# Altium footprint library Amirreza.PcbLib: 524 footprints (part 2 of 33)
Each footprint in its own frame and in the unit in brackets; x right, y up, seen from the top. Pads: shape width x height; smd on the part's side, far side on the other; paste and mask are expansions set on the pad; w line width, h text height; cw(c..) or ccw(c..) is an arc to the next point about the centre after c.
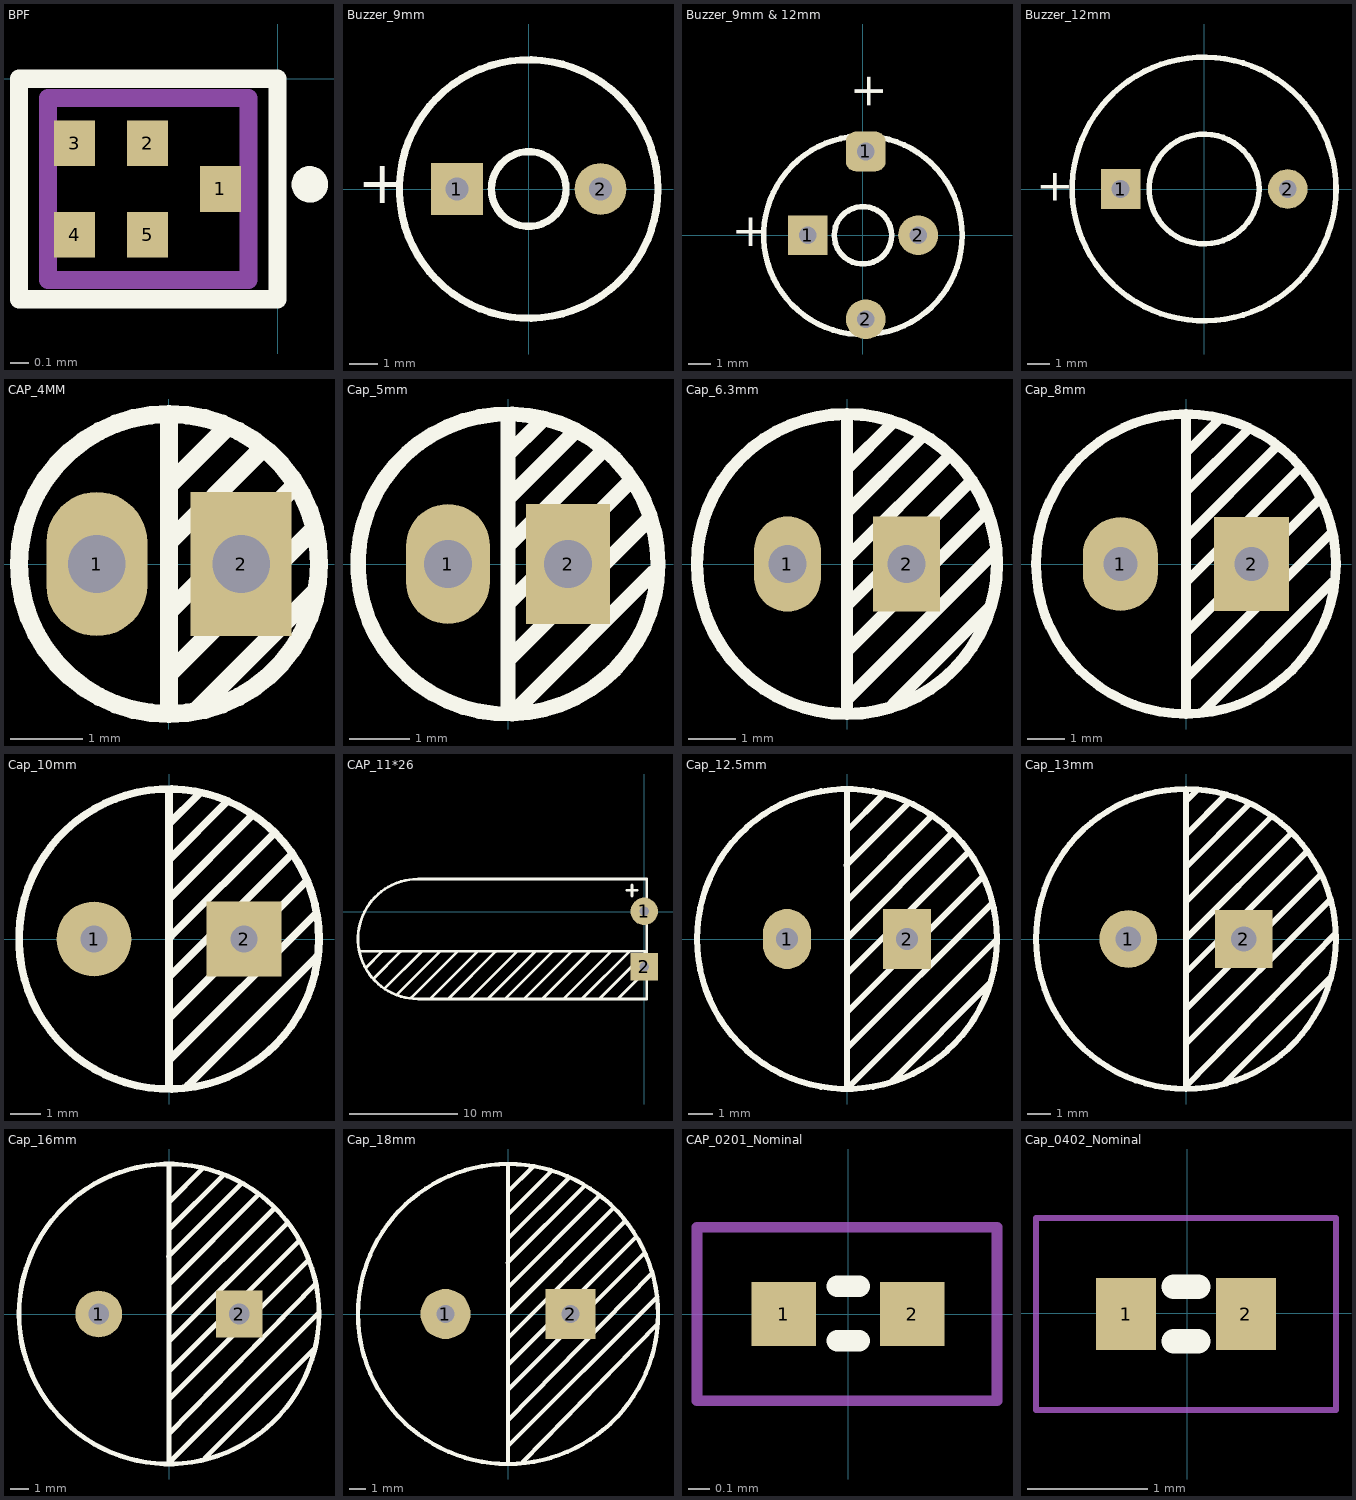
[diagram p1: the footprints below, top view; thin cyan lines are the x and y axes]

## BPF [mm]
pads (5):
  rect 0.225x0.25 smd: 1(-0.314,-0.605) 2(-0.714,-0.355) 3(-1.114,-0.355) 4(-1.114,-0.855) 5(-0.714,-0.855)
Top Overlay:
  circle w0.1: c0.177,-0.58 r0.05
  lines w0.1: -1.42,-1.21 0,-1.21 0,0 -1.42,0 -1.42,-1.21
Top Assembly:
  lines w0.1: -1.26,-1.105 -0.16,-1.105 -0.16,-0.105 -1.26,-0.105 -1.26,-1.105
3D body "User Library-SAFFB1G56KB0F0A.STEP": height 0.15, standoff 0, extent -1.26,-1.055 -0.16,-0.155

## Buzzer_9mm [mm]
pads (2):
  rect 1.8x1.8 hole 0.8: 1(-2.5,0)
  round 1.8 hole 0.8: 2(2.5,0)
Top Overlay:
  circle w0.254: c0,0 r4.5
  circle w0.254: c0,0 r1.3
  text "+" at -5.944,0.787 h1.5
3D body "User Library-Buzzer_9mm.STEP": height 5.6, standoff -5.4, extent -4.55,-4.55 4.55,4.55

## Buzzer_9mm & 12mm [mm]
pads (4):
  rect 1.8x1.8 hole 0.8: 1(-2.5,0)
  rrect50% 1.8x1.8 hole 0.8: 1(0.127,3.8)
  round 1.8 hole 0.8: 2(0.127,-3.8) 2(2.5,0)
Top Overlay:
  circle w0.254: c0,0 r4.5
  circle w0.254: c0,0 r1.3
  text "+" at -5.944,0.787 h1.5
  text "+" at 0.914,7.396 h1.5
3D body "User Library-Buzzer_9mm.STEP": height 5.6, standoff -5.4, extent -4.55,-4.55 4.55,4.55

## Buzzer_12mm [mm]
pads (2):
  rect 1.8x1.8 hole 0.8: 1(-3.8,0)
  round 1.8 hole 0.8: 2(3.8,0)
Top Overlay:
  circle w0.254: c0,0 r2.5
  circle w0.254: c0,0 r6
  text "+" at -7.645,0.711 h1.5
3D body "User Library-buzzer12.step": height 7.53, standoff -1.97, extent -6,-5.993 6,5.993

## CAP_4MM [mm]
height 2.65
pads (2):
  oval 1.4x2 hole 0.8: 1(-1,0)
  rect 1.4x2 hole 0.8: 2(1,0)
Top Overlay:
  circle w0.254: c0,0 r2.08
  lines w0.254: 0,-2.057 0,2.057 ; 0,-0.66 1.727,1.067 ; 0,0.305 1.245,1.549 ; 0,1.092 0.787,1.88 ; 0.025,-1.499 1.969,0.445 ; 0.381,-2.032 2.032,-0.381
3D body "User Library-ECAP4_6_15.step": height 6.05, standoff -2.25, extent -2,-2 2,2

## Cap_5mm [mm]
pads (2):
  oval 1.4x2 hole 0.8: 1(-1,0)
  rect 1.4x2 hole 0.8: 2(1,0)
Top Overlay:
  circle w0.254: c0,0 r2.5
  lines w0.254: 0,-2.413 0,2.489 ; 0,-1.6 2.349,0.749 ; 0,-0.66 2.045,1.384 ; 0,0.305 1.549,1.854 ; 0,1.092 1.092,2.184 ; 0,1.829 0.539,2.368 ; 0.076,-2.489 2.413,-0.152
3D body "User Library-Cap electro 5x11x2mm.step": height 11.33, standoff -3.47, extent -2.525,-2.525 2.526,2.526

## Cap_6.3mm [mm]
pads (2):
  oval 1.4x2 hole 0.8: 1(-1.25,0)
  rect 1.4x2 hole 0.8: 2(1.25,0)
Top Overlay:
  circle w0.254: c0,0 r3.15
  lines w0.254: 0,-3.073 0,3.124 ; 0,-2.845 3.086,0.241 ; 0,-1.829 2.934,1.105 ; 0,-0.864 2.578,1.714 ; 0,1.092 1.562,2.654 ; 0.02,2.026 0.94,2.946 ; 0.051,0.178 2.146,2.273 ; 0.965,-2.946 2.997,-0.914
3D body "User Library-ECAP6_3_6_5_25.step": height 6.55, standoff -2.25, extent -3.15,-3.149 3.15,3.148

## Cap_8mm [mm]
pads (2):
  oval 2x2.5 hole 0.9: 1(-1.75,0)
  rect 2x2.5 hole 0.9: 2(1.75,0)
Top Overlay:
  circle w0.254: c0,0 r4
  lines w0.254: 0,-3.912 0,3.835 ; 0,-3.048 3.861,0.813 ; 0,-1.829 3.569,1.74 ; 0,-0.483 3.048,2.565 ; 0,0.711 2.388,3.099 ; 0,1.93 1.618,3.549 ; 0.045,3.017 0.889,3.861 ; 0.432,-3.962 3.924,-0.47 ; 1.737,-0.072 1.737,0.182
3D body "User Library-ECAP8_8_35.step": height 8.05, standoff -2.25, extent -4,-3.998 4,3.998

## Cap_10mm [mm]
pads (2):
  round 2.5 hole 0.9: 1(-2.5,0)
  rect 2.5x2.5 hole 0.9: 2(2.5,0)
Top Overlay:
  circle w0.254: c0,0 r5
  lines w0.254: 0,-4.928 0,4.928 ; 0,-4.039 4.902,0.864 ; 0,-2.642 4.521,1.88 ; 0,1.346 2.743,4.089 ; 0,2.642 1.943,4.585 ; 0,3.835 0.978,4.813 ; 0.076,-1.194 4.077,2.807 ; 0.076,0.102 3.505,3.531 ; 0.635,-4.877 4.928,-0.584 ; 1.737,-0.072 1.737,0.182
3D body "User Library-Cap electro 10x12_5x5_0mm.STEP": height 12.83, standoff -3.68, extent -5.025,-5.025 5.026,5.026

## CAP_11*26 [mm]
pads (2):
  round 2.524 hole 0.9: 1(-0.006,0.025)
  rect 2.524x2.524 hole 0.9: 2(-0.006,-5.055)
Top Overlay:
  lines w0.254: -26.111,-3.632 0.223,-3.632 0.223,-3.652 -4.14,-8.015 ; -25.52,-5.138 -24.06,-3.677 ; -24.822,-6.115 -22.383,-3.677 ; -23.806,-7.03 -20.428,-3.652 ; -22.701,-7.601 -18.751,-3.652 ; -21.431,-7.932 -17.151,-3.652 ; -19.621,-7.976 -15.322,-3.677 ; -17.92,-7.951 -13.646,-3.677 ; -16.015,-7.976 -11.69,-3.652 ; -14.364,-8.002 -10.014,-3.652 ; -12.776,-8.015 -8.413,-3.652 ; -10.986,-7.976 -6.686,-3.677 ; -9.284,-7.951 -5.01,-3.677 ; -7.379,-7.976 -3.054,-3.652 ; -5.728,-8.002 -1.378,-3.652 ; -2.394,-7.97 0.271,-5.306 ; -1.606,1.969 -0.641,1.969 ; -1.123,1.436 -1.123,2.452 ; 0.223,-8.015 -20.777,-8.015 cw(c-20.777,-2.515) -20.777,2.985 0.223,2.985 0.223,-7.964

## Cap_12.5mm [mm]
pads (2):
  oval 2x2.5 hole 0.9: 1(-2.5,0)
  rect 2x2.5 hole 0.9: 2(2.5,0)
Top Overlay:
  circle w0.254: c0,0 r6.25
  lines w0.254: -0.025,3.073 2.54,5.639 ; 0,-4.547 6.045,1.499 ; 0,-3.048 5.626,2.578 ; 0,-1.448 5.08,3.632 ; 0,1.6 3.492,5.093 ; 0,4.521 1.486,6.007 ; 0,6.248 0,-6.248 6.249,0.001 ; 0.076,0.102 4.394,4.42 ; 1.737,-0.072 1.737,0.182 ; 1.918,-5.88 5.969,-1.829
3D body "User Library-JAMICON_TK_D(12_5)F(5)L(20).step": height 20.08, standoff -1.45, extent -6.25,-6.25 6.28,6.25

## Cap_13mm [mm]
pads (2):
  round 2.5 hole 1.1: 1(-2.5,0)
  rect 2.5x2.5 hole 1.1: 2(2.5,0)
Top Overlay:
  circle w0.254: c0,0 r6.5
  lines w0.254: 0,-6.497 0,6.499 ; 0,-6.375 6.487,0.244 ; 0,-4.547 6.248,1.702 ; 0,-3.048 5.842,2.794 ; 0,-1.448 5.232,3.785 ; 0,1.6 3.708,5.309 ; 0,4.521 1.727,6.248 ; 0,5.969 0.508,6.477 ; 0.025,3.124 2.769,5.867 ; 0.076,0.102 4.572,4.597 ; 1.651,-6.274 6.274,-1.651
3D body "User Library-Cap-EL(13x25-5).step": height 25.1, standoff -3.2, extent -6.5,-6.499 6.502,6.499

## Cap_16mm [mm]
pads (2):
  round 2.5 hole 1.1: 1(-3.75,0)
  rect 2.5x2.5 hole 1.1: 2(3.75,0)
Top Overlay:
  circle w0.254: c0,0 r8
  lines w0.254: -0.025,3.073 3.848,6.947 ; 0,-6.375 7.77,1.552 ; 0,-4.547 7.366,2.819 ; 0,-3.048 6.947,3.899 ; 0,-1.448 6.299,4.851 ; 0,1.6 4.763,6.363 ; 0,4.521 2.857,7.379 ; 0,5.969 1.803,7.772 ; 0,8.001 0,-7.925 7.962,0.038 ; 0.076,0.102 5.601,5.626 ; 1.905,-7.696 7.747,-1.854
3D body "User Library-JAMICON_TK_D(16)F(7_5)L(25).step": height 25.13, standoff -1.4, extent -8,-8 8.03,8

## Cap_18mm [mm]
pads (2):
  round 3 hole 1.1: 1(-3.75,0)
  rect 3x3 hole 1.1: 2(3.75,0)
Top Overlay:
  circle w0.254: c0,0 r9
  lines w0.254: -0.025,3.073 4.585,7.683 ; 0,-8.992 0,8.941 ; 0,-7.925 8.954,1.029 ; 0,-6.375 8.613,2.413 ; 0,-4.547 8.141,3.594 ; 0,-3.048 7.645,4.597 ; 0,-1.448 7.01,5.563 ; 0,1.6 5.474,7.074 ; 0,4.521 3.658,8.179 ; 0,5.969 2.591,8.56 ; 0,7.341 1.46,8.801 ; 0.076,0.102 6.325,6.35 ; 0.889,-8.89 8.963,-0.607
3D body "User Library-JAMICON_TK_D(18)F(7_5)L(40).step": height 40.08, standoff -1.45, extent -9,-9 9.03,9

## CAP_0201_Nominal [mm] "CHIP Resistor, 0.5x0.25mm, 0201, soldered"
pads (2):
  rect 0.3x0.3 smd mask+0.05: 1(-0.3,0) 2(0.3,0)
Top Overlay:
  lines w0.102: -0.051,-0.124 0.051,-0.124 ; -0.051,0.13 0.051,0.13
Mechanical 13:
  lines w0.05: -0.704,-0.404 0.694,-0.404 0.694,0.404 -0.704,0.404 -0.704,-0.404
3D body "c0201_Cap.step": height 0.31, standoff 0, extent -0.44,-0.15 0.44,0.15

## Cap_0402_Nominal [mm]
pads (2):
  rect 0.5x0.6 smd: 1(-0.511,-0.008) 2(0.489,-0.008)
Top Overlay:
  lines w0.203: -0.112,-0.236 0.091,-0.236 ; -0.112,0.221 0.091,0.221
Mechanical 13:
  lines w0.05: -1.261,-0.808 1.239,-0.808 1.239,0.792 -1.261,0.792 -1.261,-0.808
3D body "capacitor_rnd150mt15n100f100.stp": height 0.5, standoff 0, extent -0.511,-0.253 0.489,0.247